# Altium integrated library Tact_Switches_rev15a.intlib: 108 symbols
Pins are listed as number, name and electrical type; pins without a type are passive.

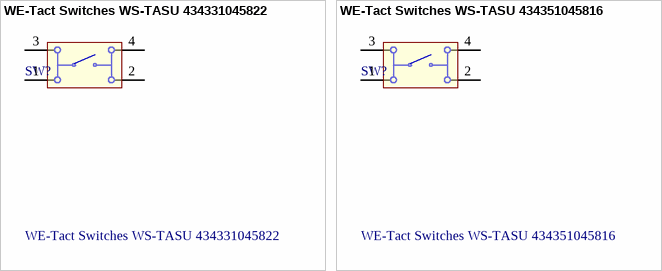
[diagram p0: symbols WE-Tact Switches WS-TASU 434331045822 to WE-Tact Switches WS-TASU 434351045816]

## WE-Tact Switches WS-TASU 434331045822
designator SW?
WS-TASU SMD Tact Switch 4.7X3.5 mm side push; Manufacturer: Würth Elektronik eiSos GmbH & Co.KG; ComponentLink1 Description: Manufacturer; ComponentLink2 Description: Datasheet; Creat by: Karrer Zheng; NoPins: 04; Creat Date: 6 March February 2014; partNo: 434331045822; ComponentLink1URL: http://www.we-online.com; ComponentLink2URL: http://katalog.we-online.de/em/datasheet/434331045822.pdf
footprint 434331045822 (4.7*3.5mm side push type,SMD, height 1.65mm, black actuator, 220gf, T&R)
pins: 1, 2, 3, 4

## WE-Tact Switches WS-TASU 434351045816
designator SW?
WS-TASU SMD Tact Switch 4.7X3.5 mm side push; Manufacturer: Würth Elektronik eiSos GmbH & Co.KG; ComponentLink1 Description: Manufacturer; ComponentLink2 Description: Datasheet; Creat by: Karrer Zheng; NoPins: 04; Creat Date: 6 March February 2014; partNo: 434351045816; ComponentLink1URL: http://www.we-online.com; ComponentLink2URL: http://katalog.we-online.de/em/datasheet/434351045816.pdf
footprint 434351045816 (4.7*3.5mm side push type, SMD, height 1.65mm, white actuator, 160gf, T&R)
pins: 1, 2, 3, 4


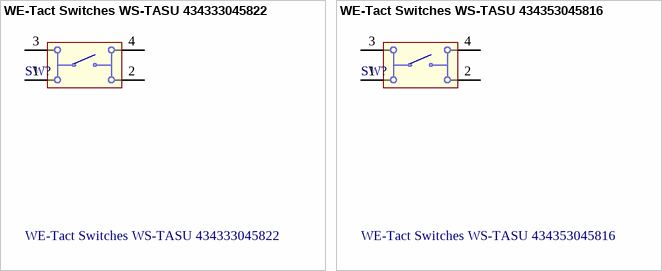
[diagram p1: symbols WE-Tact Switches WS-TASU 434333045822 to WE-Tact Switches WS-TASU 434353045816]

## WE-Tact Switches WS-TASU 434333045822
designator SW?
WS-TASU J-Bend SMD Tact Switch 4.7X3.5 mm side push; Manufacturer: Würth Elektronik eiSos GmbH & Co.KG; ComponentLink1 Description: Manufacturer; ComponentLink2 Description: Datasheet; Creat by: Karrer Zheng; NoPins: 04; Creat Date: 6 March February 2014; partNo: 434333045822; ComponentLink1URL: http://www.we-online.com; ComponentLink2URL: http://katalog.we-online.de/em/datasheet/434333045822.pdf
footprint 434333045822 (4.7*3.5mm side push type,J-Bend SMD, height 1.65mm, black actuator, 220gf, T&R)
pins: 1, 2, 3, 4

## WE-Tact Switches WS-TASU 434353045816
designator SW?
WS-TASU J-Bend SMD Tact Switch 4.7X3.5 mm side push; Manufacturer: Würth Elektronik eiSos GmbH & Co.KG; ComponentLink1 Description: Manufacturer; ComponentLink2 Description: Datasheet; Creat by: Karrer Zheng; NoPins: 04; Creat Date: 6 March February 2014; partNo: 434353045816; ComponentLink1URL: http://www.we-online.com; ComponentLink2URL: http://katalog.we-online.de/em/datasheet/434353045816.pdf
footprint 434353045816 (4.7*3.5mm side push type, J-Bend SMD, height 1.65mm, white actuator, 160gf, T&R)
pins: 1, 2, 3, 4


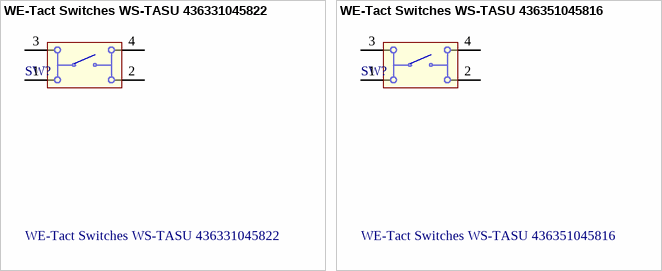
[diagram p2: symbols WE-Tact Switches WS-TASU 436331045822 to WE-Tact Switches WS-TASU 436351045816]

## WE-Tact Switches WS-TASU 436331045822
designator SW?
WS-TASU J-Bend SMD Tact Switch with boss design 4.7X3.5 mm side push; Manufacturer: Würth Elektronik eiSos GmbH & Co.KG; ComponentLink1 Description: Manufacturer; ComponentLink2 Description: Datasheet; Creat by: Karrer Zheng; NoPins: 04; Creat Date: 6 March February 2014; partNo: 436331045822; ComponentLink1URL: http://www.we-online.com; ComponentLink2URL: http://katalog.we-online.de/em/datasheet/436331045822.pdf
footprint 436331045822 (4.7*3.5mm, side push type, SMD, with boss design, height 1.65mm, black actuator , 220gf, T&R)
pins: 1, 2, 3, 4

## WE-Tact Switches WS-TASU 436351045816
designator SW?
WS-TASU J-Bend SMD Tact Switch with boss design 4.7X3.5 mm side push; Manufacturer: Würth Elektronik eiSos GmbH & Co.KG; ComponentLink1 Description: Manufacturer; ComponentLink2 Description: Datasheet; Creat by: Karrer Zheng; NoPins: 04; Creat Date: 6 March February 2014; partNo: 436351045816; ComponentLink1URL: http://www.we-online.com; ComponentLink2URL: http://katalog.we-online.de/em/datasheet/436351045816.pdf
footprint 436351045816 (4.7*3.5mm side push type, SMD with boss design,  height 1.65mm, white actuator, 160gf, T&R)
pins: 1, 2, 3, 4


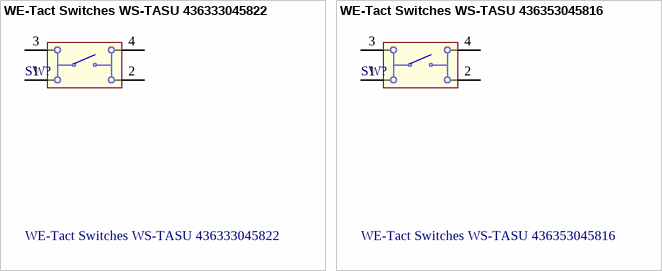
[diagram p3: symbols WE-Tact Switches WS-TASU 436333045822 to WE-Tact Switches WS-TASU 436353045816]

## WE-Tact Switches WS-TASU 436333045822
designator SW?
WS-TASU J-Bend J-Bend SMD Tact Switch with boss design 4.7X3.5 mm side push; Manufacturer: Würth Elektronik eiSos GmbH & Co.KG; ComponentLink1 Description: Manufacturer; ComponentLink2 Description: Datasheet; Creat by: Karrer Zheng; NoPins: 04; Creat Date: 6 March February 2014; partNo: 436333045822; ComponentLink1URL: http://www.we-online.com; ComponentLink2URL: http://katalog.we-online.de/em/datasheet/436333045822.pdf
footprint 436333045822 (4.7*3.5mm side push type, J-Bend SMD with boss design, height 1.65mm, black actuator, 220gf, T&R)
pins: 1, 2, 3, 4

## WE-Tact Switches WS-TASU 436353045816
designator SW?
WS-TASU J-Bend J-Bend SMD Tact Switch with boss design 4.7X3.5 mm side push; Manufacturer: Würth Elektronik eiSos GmbH & Co.KG; ComponentLink1 Description: Manufacturer; ComponentLink2 Description: Datasheet; Creat by: Karrer Zheng; NoPins: 04; Creat Date: 6 March February 2014; partNo: 436353045816; ComponentLink1URL: http://www.we-online.com; ComponentLink2URL: http://katalog.we-online.de/em/datasheet/436353045816.pdf
footprint 436353045816 (4.7*3.5mm side push type, J-Bend SMD with boss design,  height 1.65mm, white actuator, 160gf, T&R)
pins: 1, 2, 3, 4


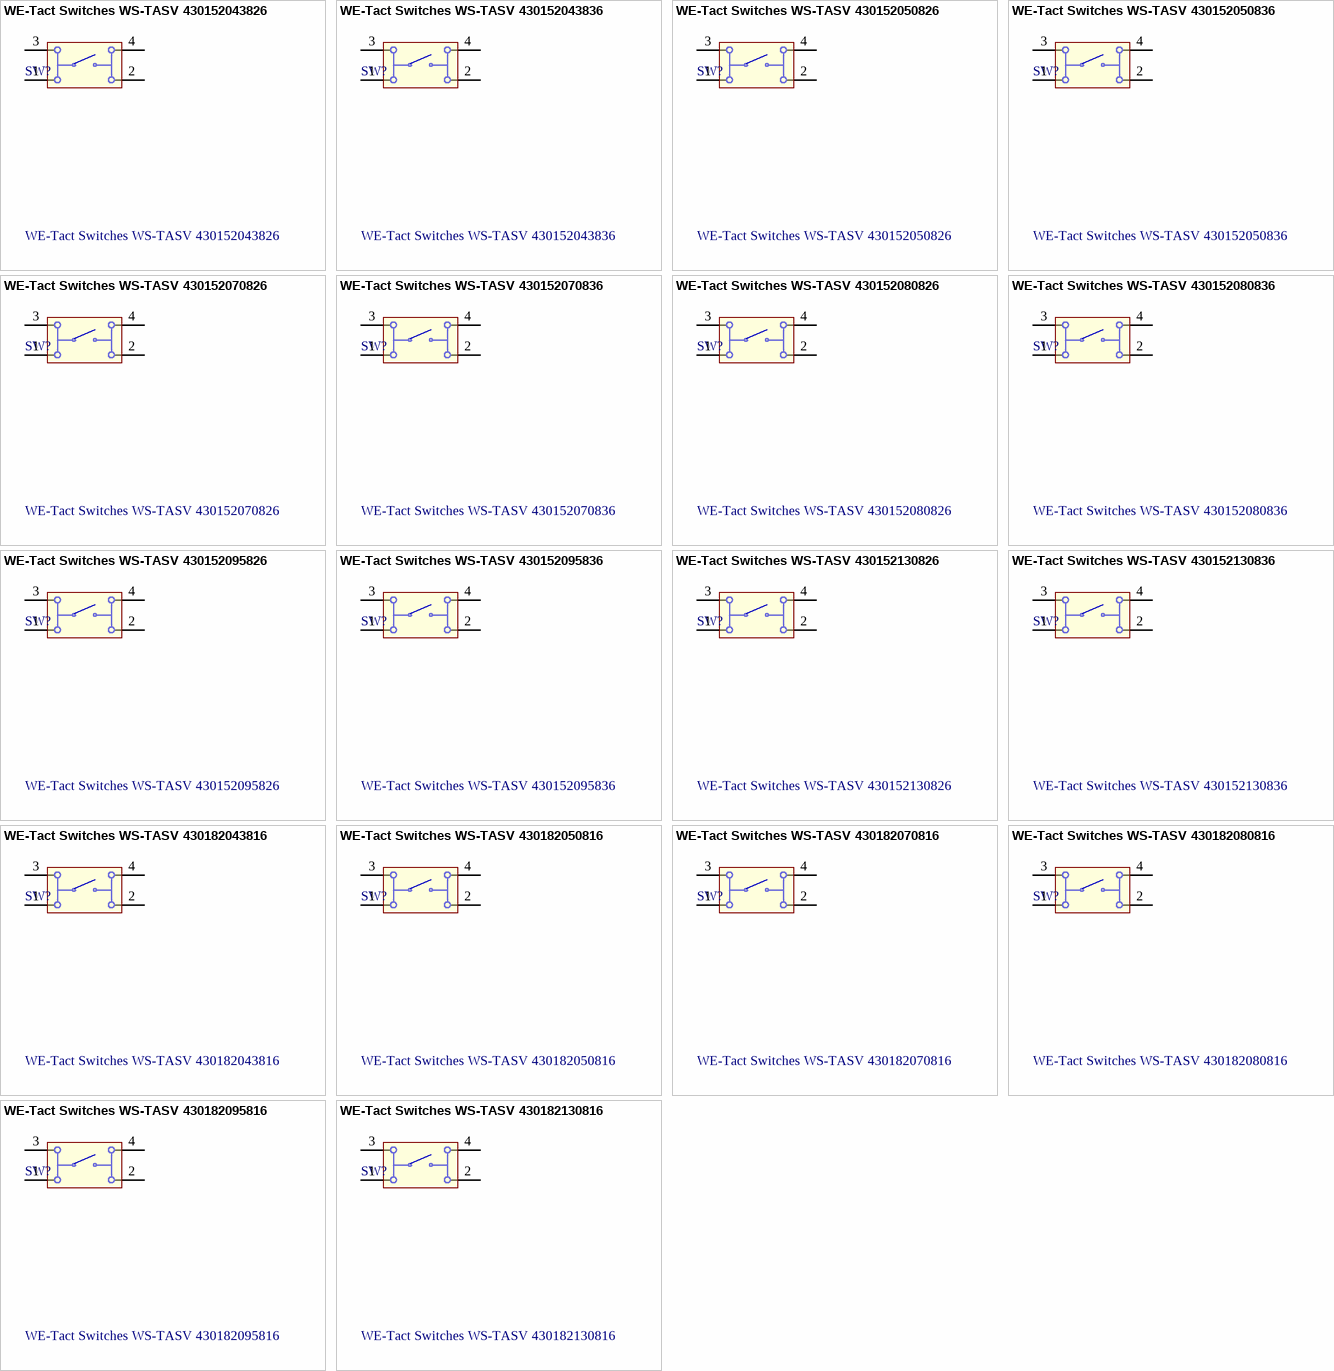
[diagram p4: symbols WE-Tact Switches WS-TASV 430152043826 to WE-Tact Switches WS-TASV 430182130816]

## WE-Tact Switches WS-TASV 430152043826
designator SW?
WS-TASV SMD Tact Switch 6X6 mm; Manufacturer: Würth Elektronik eiSos GmbH & Co.KG; ComponentLink1 Description: Manufacturer; ComponentLink2 Description: Datasheet; Creat by: Karrer Zheng; NoPins: 04; Creat Date: 28 February 2014; partNo: 430152043826; ComponentLink1URL: http://www.we-online.com; ComponentLink2URL: http://katalog.we-online.de/em/datasheet/4301x2.pdf
footprint 430152043826 (6*6mm vertical type, SMD, height 4.3mm, white actuator, 260gf, T&R)
pins: 1, 2, 3, 4

## WE-Tact Switches WS-TASV 430152043836
designator SW?
WS-TASV SMD Tact Switch 6X6 mm; Manufacturer: Würth Elektronik eiSos GmbH & Co.KG; ComponentLink1 Description: Manufacturer; ComponentLink2 Description: Datasheet; Creat by: Karrer Zheng; NoPins: 04; Creat Date: 28 February 2014; partNo: 430152043836; ComponentLink1URL: http://www.we-online.com; ComponentLink2URL: http://katalog.we-online.de/em/datasheet/4301x2.pdf
footprint 430152043836 (6*6mm vertical type, SMD, height 4.3mm, salmon actuator, 360gf, T&R)
pins: 1, 2, 3, 4

## WE-Tact Switches WS-TASV 430152050826
designator SW?
WS-TASV SMD Tact Switch 6X6 mm; Manufacturer: Würth Elektronik eiSos GmbH & Co.KG; ComponentLink1 Description: Manufacturer; ComponentLink2 Description: Datasheet; Creat by: Karrer Zheng; NoPins: 04; Creat Date: 28 February 2014; partNo: 430152050826; ComponentLink1URL: http://www.we-online.com; ComponentLink2URL: http://katalog.we-online.de/em/datasheet/4301x2.pdf
footprint 430152050826
pins: 1, 2, 3, 4

## WE-Tact Switches WS-TASV 430152050836
designator SW?
WS-TASV SMD Tact Switch 6X6 mm; Manufacturer: Würth Elektronik eiSos GmbH & Co.KG; ComponentLink1 Description: Manufacturer; ComponentLink2 Description: Datasheet; Creat by: Karrer Zheng; NoPins: 04; Creat Date: 28 February 2014; partNo: 430152050836; ComponentLink1URL: http://www.we-online.com; ComponentLink2URL: http://katalog.we-online.de/em/datasheet/4301x2.pdf
footprint 430152050836
pins: 1, 2, 3, 4

## WE-Tact Switches WS-TASV 430152070826
designator SW?
WS-TASV SMD Tact Switch 6X6 mm; Manufacturer: Würth Elektronik eiSos GmbH & Co.KG; ComponentLink1 Description: Manufacturer; ComponentLink2 Description: Datasheet; Creat by: Karrer Zheng; NoPins: 04; Creat Date: 28 February 2014; partNo: 430152070826; ComponentLink1URL: http://www.we-online.com; ComponentLink2URL: http://katalog.we-online.de/em/datasheet/4301x2.pdf
footprint 430152070826
pins: 1, 2, 3, 4

## WE-Tact Switches WS-TASV 430152070836
designator SW?
WS-TASV SMD Tact Switch 6X6 mm; Manufacturer: Würth Elektronik eiSos GmbH & Co.KG; ComponentLink1 Description: Manufacturer; ComponentLink2 Description: Datasheet; Creat by: Karrer Zheng; NoPins: 04; Creat Date: 28 February 2014; partNo: 430152070836; ComponentLink1URL: http://www.we-online.com; ComponentLink2URL: http://katalog.we-online.de/em/datasheet/4301x2.pdf
footprint 430152070836
pins: 1, 2, 3, 4

## WE-Tact Switches WS-TASV 430152080826
designator SW?
WS-TASV SMD Tact Switch 6X6 mm; Manufacturer: Würth Elektronik eiSos GmbH & Co.KG; ComponentLink1 Description: Manufacturer; ComponentLink2 Description: Datasheet; Creat by: Karrer Zheng; NoPins: 04; Creat Date: 28 February 2014; partNo: 430152080826; ComponentLink1URL: http://www.we-online.com; ComponentLink2URL: http://katalog.we-online.de/em/datasheet/4301x2.pdf
footprint 430152080826
pins: 1, 2, 3, 4

## WE-Tact Switches WS-TASV 430152080836
designator SW?
WS-TASV SMD Tact Switch 6X6 mm; Manufacturer: Würth Elektronik eiSos GmbH & Co.KG; ComponentLink1 Description: Manufacturer; ComponentLink2 Description: Datasheet; Creat by: Karrer Zheng; NoPins: 04; Creat Date: 28 February 2014; partNo: 430152080836; ComponentLink1URL: http://www.we-online.com; ComponentLink2URL: http://katalog.we-online.de/em/datasheet/4301x2.pdf
footprint 430152080836
pins: 1, 2, 3, 4

## WE-Tact Switches WS-TASV 430152095826
designator SW?
WS-TASV SMD Tact Switch 6X6 mm; Manufacturer: Würth Elektronik eiSos GmbH & Co.KG; ComponentLink1 Description: Manufacturer; ComponentLink2 Description: Datasheet; Creat by: Karrer Zheng; NoPins: 04; Creat Date: 28 February 2014; partNo: 430152095826; ComponentLink1URL: http://www.we-online.com; ComponentLink2URL: http://katalog.we-online.de/em/datasheet/4301x2.pdf
footprint 430152095826
pins: 1, 2, 3, 4

## WE-Tact Switches WS-TASV 430152095836
designator SW?
WS-TASV SMD Tact Switch 6X6 mm; Manufacturer: Würth Elektronik eiSos GmbH & Co.KG; ComponentLink1 Description: Manufacturer; ComponentLink2 Description: Datasheet; Creat by: Karrer Zheng; NoPins: 04; Creat Date: 28 February 2014; partNo: 430152095836; ComponentLink1URL: http://www.we-online.com; ComponentLink2URL: http://katalog.we-online.de/em/datasheet/4301x2.pdf
footprint 430152095836
pins: 1, 2, 3, 4

## WE-Tact Switches WS-TASV 430152130826
designator SW?
WS-TASV SMD Tact Switch 6X6 mm; Manufacturer: Würth Elektronik eiSos GmbH & Co.KG; ComponentLink1 Description: Manufacturer; ComponentLink2 Description: Datasheet; Creat by: Karrer Zheng; NoPins: 04; Creat Date: 28 February 2014; partNo: 430152130826; ComponentLink1URL: http://www.we-online.com; ComponentLink2URL: http://katalog.we-online.de/em/datasheet/4301x2.pdf
footprint 430152130826
pins: 1, 2, 3, 4

## WE-Tact Switches WS-TASV 430152130836
designator SW?
WS-TASV SMD Tact Switch 6X6 mm; Manufacturer: Würth Elektronik eiSos GmbH & Co.KG; ComponentLink1 Description: Manufacturer; ComponentLink2 Description: Datasheet; Creat by: Karrer Zheng; NoPins: 04; Creat Date: 28 February 2014; partNo: 430152130836; ComponentLink1URL: http://www.we-online.com; ComponentLink2URL: http://katalog.we-online.de/em/datasheet/4301x2.pdf
footprint 430152130836
pins: 1, 2, 3, 4

## WE-Tact Switches WS-TASV 430182043816
designator SW?
WS-TASV SMD Tact Switch 6X6 mm; Manufacturer: Würth Elektronik eiSos GmbH & Co.KG; ComponentLink1 Description: Manufacturer; ComponentLink2 Description: Datasheet; Creat by: Karrer Zheng; NoPins: 04; Creat Date: 28 February 2014; partNo: 430182043816; ComponentLink1URL: http://www.we-online.com; ComponentLink2URL: http://katalog.we-online.de/em/datasheet/4301x2.pdf
footprint 430182043816
pins: 1, 2, 3, 4

## WE-Tact Switches WS-TASV 430182050816
designator SW?
WS-TASV SMD Tact Switch 6X6 mm; Manufacturer: Würth Elektronik eiSos GmbH & Co.KG; ComponentLink1 Description: Manufacturer; ComponentLink2 Description: Datasheet; Creat by: Karrer Zheng; NoPins: 04; Creat Date: 28 February 2014; partNo: 430182050816; ComponentLink1URL: http://www.we-online.com; ComponentLink2URL: http://katalog.we-online.de/em/datasheet/4301x2.pdf
footprint 430182050816
pins: 1, 2, 3, 4

## WE-Tact Switches WS-TASV 430182070816
designator SW?
WS-TASV SMD Tact Switch 6X6 mm; Manufacturer: Würth Elektronik eiSos GmbH & Co.KG; ComponentLink1 Description: Manufacturer; ComponentLink2 Description: Datasheet; Creat by: Karrer Zheng; NoPins: 04; Creat Date: 28 February 2014; partNo: 430182070816; ComponentLink1URL: http://www.we-online.com; ComponentLink2URL: http://katalog.we-online.de/em/datasheet/4301x2.pdf
footprint 430182070816
pins: 1, 2, 3, 4

## WE-Tact Switches WS-TASV 430182080816
designator SW?
WS-TASV SMD Tact Switch 6X6 mm; Manufacturer: Würth Elektronik eiSos GmbH & Co.KG; ComponentLink1 Description: Manufacturer; ComponentLink2 Description: Datasheet; Creat by: Karrer Zheng; NoPins: 04; Creat Date: 28 February 2014; partNo: 430182080816; ComponentLink1URL: http://www.we-online.com; ComponentLink2URL: http://katalog.we-online.de/em/datasheet/4301x2.pdf
footprint 430182080816 (6*6mm vertical type, SMD, height 8.0mm, black actuator, 160gf, T&R)
pins: 1, 2, 3, 4

## WE-Tact Switches WS-TASV 430182095816
designator SW?
WS-TASV SMD Tact Switch 6X6 mm; Manufacturer: Würth Elektronik eiSos GmbH & Co.KG; ComponentLink1 Description: Manufacturer; ComponentLink2 Description: Datasheet; Creat by: Karrer Zheng; NoPins: 04; Creat Date: 28 February 2014; partNo: 430182095816; ComponentLink1URL: http://www.we-online.com; ComponentLink2URL: http://katalog.we-online.de/em/datasheet/4301x2.pdf
footprint 430182095816
pins: 1, 2, 3, 4

## WE-Tact Switches WS-TASV 430182130816
designator SW?
WS-TASV SMD Tact Switch 6X6 mm; Manufacturer: Würth Elektronik eiSos GmbH & Co.KG; ComponentLink1 Description: Manufacturer; ComponentLink2 Description: Datasheet; Creat by: Karrer Zheng; NoPins: 04; Creat Date: 28 February 2014; partNo: 430182130816; ComponentLink1URL: http://www.we-online.com; ComponentLink2URL: http://katalog.we-online.de/em/datasheet/4301x2.pdf
footprint 430182130816
pins: 1, 2, 3, 4


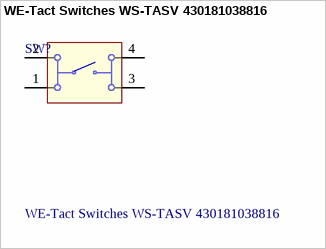
[diagram p5: symbol WE-Tact Switches WS-TASV 430181038816]

## WE-Tact Switches WS-TASV 430181038816
designator SW?
WS-TASV SMD Tact Switch 4.5X4.5 mm; Manufacturer: W¨¹rth Elektronik eiSos GmbH & Co.KG; ComponentLink1 Description: Manufacturer; ComponentLink2 Description: Datasheet; Creat by: Karrer Zheng; NoPins: 04; Creat Date: 5 March February 2014; partNo: 430181038816; ComponentLink1URL: http://www.we-online.com; ComponentLink2URL: http://katalog.we-online.de/em/datasheet/430181038816.pdf
footprint 430181038816 (4.5*4.5mm vertical type, SMD, height 3.8mm, black actuator, 160gf, T&R)
pins: 1, 2, 3, 4


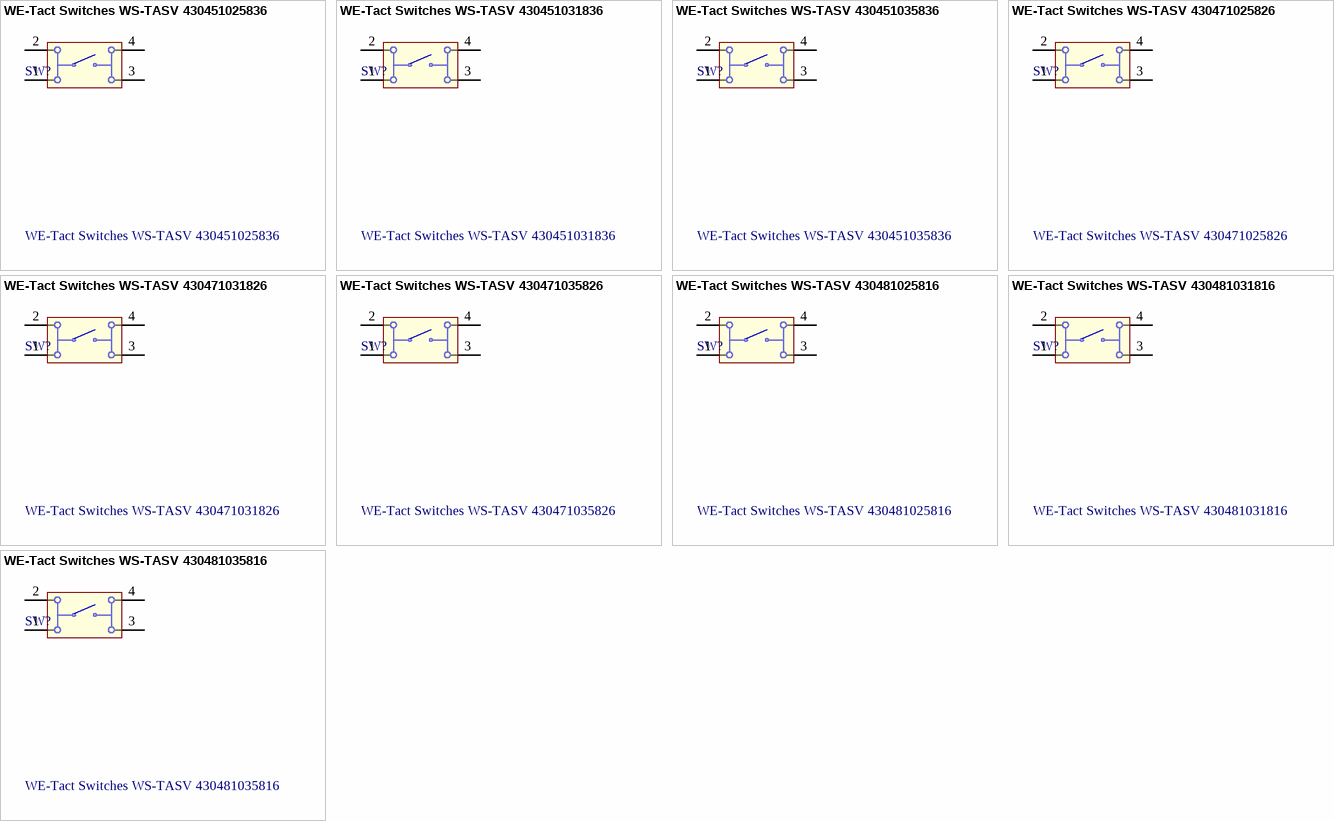
[diagram p6: symbols WE-Tact Switches WS-TASV 430451025836 to WE-Tact Switches WS-TASV 430481035816]

## WE-Tact Switches WS-TASV 430451025836
designator SW?
WS-TASV SMD Tact Switch 6X6 mm; Manufacturer: Würth Elektronik eiSos GmbH & Co.KG; ComponentLink1 Description: Manufacturer; ComponentLink2 Description: Datasheet; Creat by: Karrer Zheng; NoPins: 04; Creat Date: 4 March February 2014; partNo: 430451025836; ComponentLink1URL: http://www.we-online.com; ComponentLink2URL: http://katalog.we-online.de/em/datasheet/4304x1.pdf
footprint 430451025836 (6*6mm vertical type, SMD, height 2.5mm, salmon actuator, 360gf, T&R)
pins: 1, 2, 3, 4

## WE-Tact Switches WS-TASV 430451031836
designator SW?
WS-TASV SMD Tact Switch 6X6 mm; Manufacturer: Würth Elektronik eiSos GmbH & Co.KG; ComponentLink1 Description: Manufacturer; ComponentLink2 Description: Datasheet; Creat by: Karrer Zheng; NoPins: 04; Creat Date: 4 March February 2014; partNo: 430451031836; ComponentLink1URL: http://www.we-online.com; ComponentLink2URL: http://katalog.we-online.de/em/datasheet/4304x1.pdf
footprint 430451031836 (6*6mm vertical type,SMD, height 3.1mm, salmon actuator, 360gf, T&R)
pins: 1, 2, 3, 4

## WE-Tact Switches WS-TASV 430451035836
designator SW?
WS-TASV SMD Tact Switch 6X6 mm; Manufacturer: Würth Elektronik eiSos GmbH & Co.KG; ComponentLink1 Description: Manufacturer; ComponentLink2 Description: Datasheet; Creat by: Karrer Zheng; NoPins: 04; Creat Date: 4 March February 2014; partNo: 430451035836; ComponentLink1URL: http://www.we-online.com; ComponentLink2URL: http://katalog.we-online.de/em/datasheet/4304x1.pdf
footprint 430451035836 (6*6mm vertical type,SMD,  height 3.5mm, salmon actuator, 360gf, T&R)
pins: 1, 2, 3, 4

## WE-Tact Switches WS-TASV 430471025826
designator SW?
WS-TASV SMD Tact Switch 6X6 mm; Manufacturer: Würth Elektronik eiSos GmbH & Co.KG; ComponentLink1 Description: Manufacturer; ComponentLink2 Description: Datasheet; Creat by: Karrer Zheng; NoPins: 04; Creat Date: 4 March February 2014; partNo: 430471025826; ComponentLink1URL: http://www.we-online.com; ComponentLink2URL: http://katalog.we-online.de/em/datasheet/4304x1.pdf
footprint 430471025826 (6*6mm vertical type,SMD, height 2.5mm, white actuator, 260gf, T&R)
pins: 1, 2, 3, 4

## WE-Tact Switches WS-TASV 430471031826
designator SW?
WS-TASV SMD Tact Switch 6X6 mm; Manufacturer: Würth Elektronik eiSos GmbH & Co.KG; ComponentLink1 Description: Manufacturer; ComponentLink2 Description: Datasheet; Creat by: Karrer Zheng; NoPins: 04; Creat Date: 4 March February 2014; partNo: 430471031826; ComponentLink1URL: http://www.we-online.com; ComponentLink2URL: http://katalog.we-online.de/em/datasheet/4304x1.pdf
footprint 430471031826 (6*6mm vertical type,SMD, height 3.1mm, white actuator, 260gf, T&R)
pins: 1, 2, 3, 4

## WE-Tact Switches WS-TASV 430471035826
designator SW?
WS-TASV SMD Tact Switch 6X6 mm; Manufacturer: Würth Elektronik eiSos GmbH & Co.KG; ComponentLink1 Description: Manufacturer; ComponentLink2 Description: Datasheet; Creat by: Karrer Zheng; NoPins: 04; Creat Date: 4 March February 2014; partNo: 430471035826; ComponentLink1URL: http://www.we-online.com; ComponentLink2URL: http://katalog.we-online.de/em/datasheet/4304x1.pdf
footprint 430471035826 (6*6mm vertical type,SMD,  height 3.5mm, white actuator, 260gf, T&R)
pins: 1, 2, 3, 4

## WE-Tact Switches WS-TASV 430481025816
designator SW?
WS-TASV SMD Tact Switch 6X6 mm; Manufacturer: Würth Elektronik eiSos GmbH & Co.KG; ComponentLink1 Description: Manufacturer; ComponentLink2 Description: Datasheet; Creat by: Karrer Zheng; NoPins: 04; Creat Date: 4 March February 2014; partNo: 430481025816; ComponentLink1URL: http://www.we-online.com; ComponentLink2URL: http://katalog.we-online.de/em/datasheet/4304x1.pdf
footprint 430481025816 (6*6mm vertical type,SMD, height 2.5mm, black actuator, 160gf, T&R)
pins: 1, 2, 3, 4

## WE-Tact Switches WS-TASV 430481031816
designator SW?
WS-TASV SMD Tact Switch 6X6 mm; Manufacturer: Würth Elektronik eiSos GmbH & Co.KG; ComponentLink1 Description: Manufacturer; ComponentLink2 Description: Datasheet; Creat by: Karrer Zheng; NoPins: 04; Creat Date: 4 March February 2014; partNo: 430481031816; ComponentLink1URL: http://www.we-online.com; ComponentLink2URL: http://katalog.we-online.de/em/datasheet/4304x1.pdf
footprint 430481031816 (6*6mm vertical type,SMD, height 3.1mm, black actuator, 160gf, T&R)
pins: 1, 2, 3, 4

## WE-Tact Switches WS-TASV 430481035816
designator SW?
WS-TASV SMD Tact Switch 6X6 mm; Manufacturer: Würth Elektronik eiSos GmbH & Co.KG; ComponentLink1 Description: Manufacturer; ComponentLink2 Description: Datasheet; Creat by: Karrer Zheng; NoPins: 04; Creat Date: 4 March February 2014; partNo: 430481035816; ComponentLink1URL: http://www.we-online.com; ComponentLink2URL: http://katalog.we-online.de/em/datasheet/4304x1.pdf
footprint 430481035816 (6*6mm vertical type,SMD, height 3.5mm, black actuator, 160gf, T&R)
pins: 1, 2, 3, 4


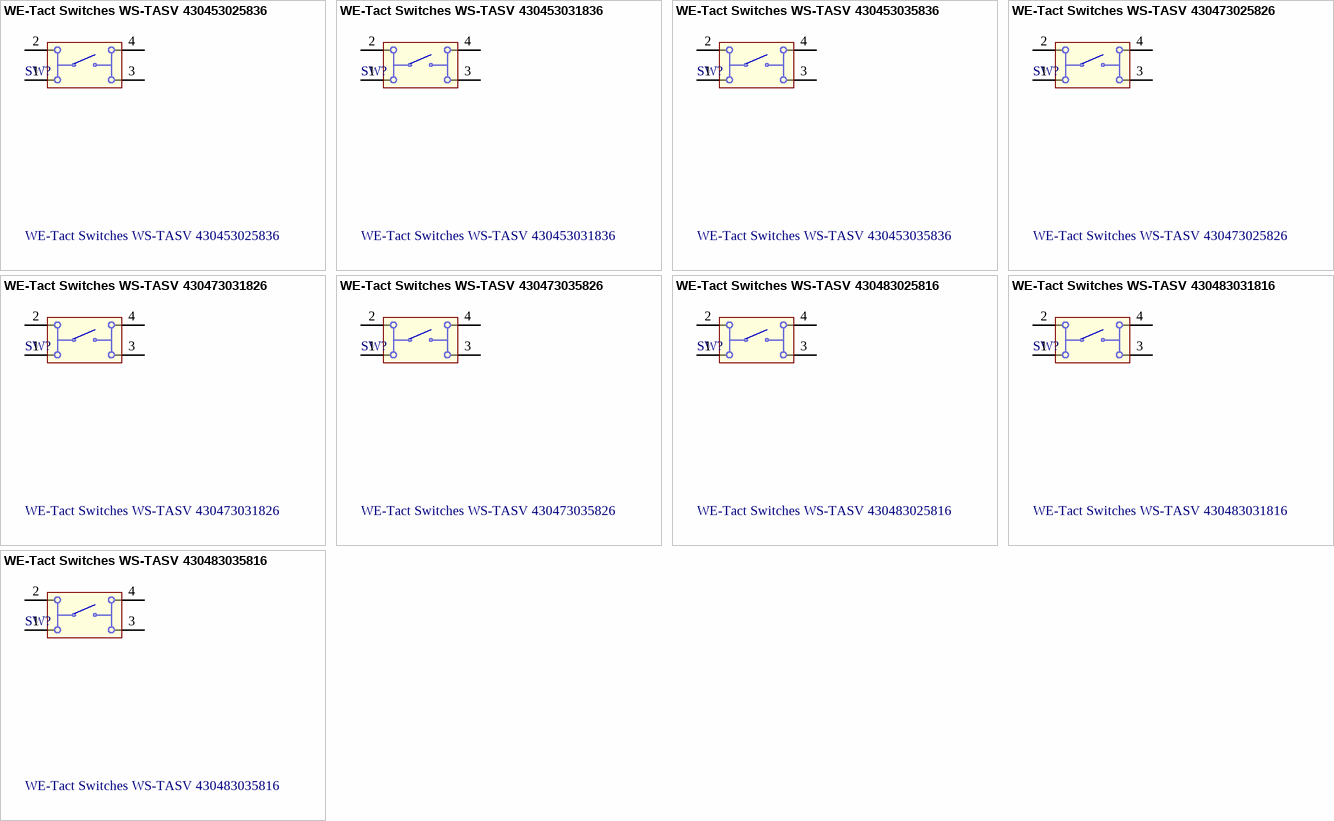
[diagram p7: symbols WE-Tact Switches WS-TASV 430453025836 to WE-Tact Switches WS-TASV 430483035816]

## WE-Tact Switches WS-TASV 430453025836
designator SW?
WS-TASV J-Bend SMD Tact Switch 6X6 mm; Manufacturer: Würth Elektronik eiSos GmbH & Co.KG; ComponentLink1 Description: Manufacturer; ComponentLink2 Description: Datasheet; Creat by: Karrer Zheng; NoPins: 04; Creat Date: 4 March February 2014; partNo: 430453025836; ComponentLink1URL: http://www.we-online.com; ComponentLink2URL: http://katalog.we-online.de/em/datasheet/4304x3.pdf
footprint 430453025836 (6*6mm washable vertical type, J-Bend SMD, height 2.5mm, salmon actuator, 360gf, T&R)
pins: 1, 2, 3, 4

## WE-Tact Switches WS-TASV 430453031836
designator SW?
WS-TASV J-Bend SMD Tact Switch 6X6 mm; Manufacturer: Würth Elektronik eiSos GmbH & Co.KG; ComponentLink1 Description: Manufacturer; ComponentLink2 Description: Datasheet; Creat by: Karrer Zheng; NoPins: 04; Creat Date: 4 March February 2014; partNo: 430453031836; ComponentLink1URL: http://www.we-online.com; ComponentLink2URL: http://katalog.we-online.de/em/datasheet/4304x3.pdf
footprint 430453031836 (6*6mm vertical type, J-Bend SMD, height 3.1mm, salmon actuator, 360gf, T&R)
pins: 1, 2, 3, 4

## WE-Tact Switches WS-TASV 430453035836
designator SW?
WS-TASV J-Bend SMD Tact Switch 6X6 mm; Manufacturer: Würth Elektronik eiSos GmbH & Co.KG; ComponentLink1 Description: Manufacturer; ComponentLink2 Description: Datasheet; Creat by: Karrer Zheng; NoPins: 04; Creat Date: 4 March February 2014; partNo: 430453035836; ComponentLink1URL: http://www.we-online.com; ComponentLink2URL: http://katalog.we-online.de/em/datasheet/4304x3.pdf
footprint 430453035836 (6*6mm vertical type, J-Bend SMD,  height 3.5mm, salmon actuator, 360gf, T&R)
pins: 1, 2, 3, 4

## WE-Tact Switches WS-TASV 430473025826
designator SW?
WS-TASV J-Bend SMD Tact Switch 6X6 mm; Manufacturer: Würth Elektronik eiSos GmbH & Co.KG; ComponentLink1 Description: Manufacturer; ComponentLink2 Description: Datasheet; Creat by: Karrer Zheng; NoPins: 04; Creat Date: 4 March February 2014; partNo: 430473025826; ComponentLink1URL: http://www.we-online.com; ComponentLink2URL: http://katalog.we-online.de/em/datasheet/4304x3.pdf
footprint 430473025826 (6*6mm vertical type, J-Bend SMD, height 2.5mm, white actuator, 260gf, T&R)
pins: 1, 2, 3, 4

## WE-Tact Switches WS-TASV 430473031826
designator SW?
WS-TASV J-Bend SMD Tact Switch 6X6 mm; Manufacturer: Würth Elektronik eiSos GmbH & Co.KG; ComponentLink1 Description: Manufacturer; ComponentLink2 Description: Datasheet; Creat by: Karrer Zheng; NoPins: 04; Creat Date: 4 March February 2014; partNo: 430473031826; ComponentLink1URL: http://www.we-online.com; ComponentLink2URL: http://katalog.we-online.de/em/datasheet/4304x3.pdf
footprint 430473031826 (6*6mm vertical type, J-Bend SMD, height 3.1mm, white actuator, 260gf, T&R)
pins: 1, 2, 3, 4

## WE-Tact Switches WS-TASV 430473035826
designator SW?
WS-TASV J-Bend SMD Tact Switch 6X6 mm; Manufacturer: Würth Elektronik eiSos GmbH & Co.KG; ComponentLink1 Description: Manufacturer; ComponentLink2 Description: Datasheet; Creat by: Karrer Zheng; NoPins: 04; Creat Date: 4 March February 2014; partNo: 430473035826; ComponentLink1URL: http://www.we-online.com; ComponentLink2URL: http://katalog.we-online.de/em/datasheet/4304x3.pdf
footprint 430473035826 (6*6mm vertical type, J-Bend SMD,  height 3.5mm, white actuator, 260gf, T&R)
pins: 1, 2, 3, 4

## WE-Tact Switches WS-TASV 430483025816
designator SW?
WS-TASV J-Bend SMD Tact Switch 6X6 mm; Manufacturer: Würth Elektronik eiSos GmbH & Co.KG; ComponentLink1 Description: Manufacturer; ComponentLink2 Description: Datasheet; Creat by: Karrer Zheng; NoPins: 04; Creat Date: 4 March February 2014; partNo: 430483025816; ComponentLink1URL: http://www.we-online.com; ComponentLink2URL: http://katalog.we-online.de/em/datasheet/4304x3.pdf
footprint 430483025816 (6*6mm vertical type, J-Bend SMD, height 2.5mm, black actuator, 160gf, T&R)
pins: 1, 2, 3, 4

## WE-Tact Switches WS-TASV 430483031816
designator SW?
WS-TASV J-Bend SMD Tact Switch 6X6 mm; Manufacturer: Würth Elektronik eiSos GmbH & Co.KG; ComponentLink1 Description: Manufacturer; ComponentLink2 Description: Datasheet; Creat by: Karrer Zheng; NoPins: 04; Creat Date: 4 March February 2014; partNo: 430483031816; ComponentLink1URL: http://www.we-online.com; ComponentLink2URL: http://katalog.we-online.de/em/datasheet/4304x3.pdf
footprint 430483031816 (6*6mm vertical type, J-Bend SMD, height 3.1mm, black actuator, 160gf, T&R)
pins: 1, 2, 3, 4

## WE-Tact Switches WS-TASV 430483035816
designator SW?
WS-TASV J-Bend SMD Tact Switch 6X6 mm; Manufacturer: Würth Elektronik eiSos GmbH & Co.KG; ComponentLink1 Description: Manufacturer; ComponentLink2 Description: Datasheet; Creat by: Karrer Zheng; NoPins: 04; Creat Date: 4 March February 2014; partNo: 430483035816; ComponentLink1URL: http://www.we-online.com; ComponentLink2URL: http://katalog.we-online.de/em/datasheet/4304x3.pdf
footprint 430483035816 (6*6mm vertical type, J-Bend SMD, height 3.5mm, black actuator, 160gf, T&R)
pins: 1, 2, 3, 4


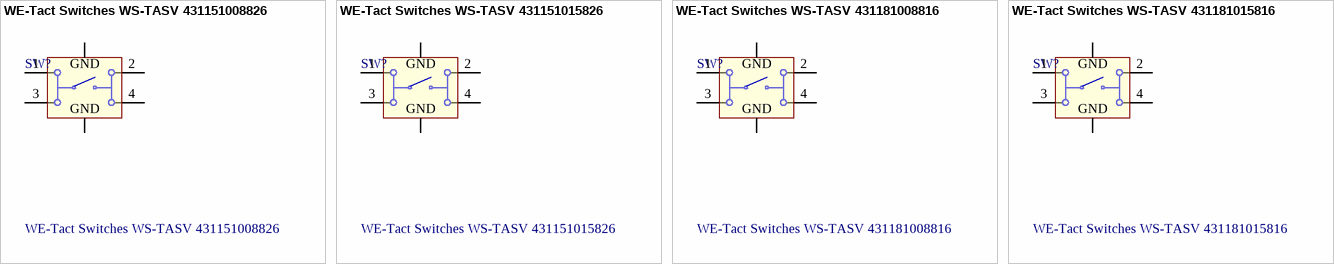
[diagram p8: symbols WE-Tact Switches WS-TASV 431151008826 to WE-Tact Switches WS-TASV 431181015816]

## WE-Tact Switches WS-TASV 431151008826
designator SW?
WS-TASV SMD Tact Switch 5X5 mm with ground terminal; Manufacturer: Würth Elektronik eiSos GmbH & Co.KG; ComponentLink1 Description: Manufacturer; ComponentLink2 Description: Datasheet; Creat by: Karrer Zheng; NoPins: 04; Creat Date: 4 March February 2014; partNo: 431151008826; ComponentLink1URL: http://www.we-online.com; ComponentLink2URL: http://katalog.we-online.de/em/datasheet/431151008826.pdf
footprint 431151008826 (5*5mm vertical type, SMD, height 0.8mm, no actuator, 260gf, Grounded Terminal, T&R)
pins: 1, 2, 3, 4, 5, 6
text: GND

## WE-Tact Switches WS-TASV 431151015826
designator SW?
WS-TASV SMD Tact Switch 5X5 mm with ground terminal; Manufacturer: Würth Elektronik eiSos GmbH & Co.KG; ComponentLink1 Description: Manufacturer; ComponentLink2 Description: Datasheet; Creat by: Karrer Zheng; NoPins: 04; Creat Date: 4 March February 2014; partNo: 431151015826; ComponentLink1URL: http://www.we-online.com; ComponentLink2URL: http://katalog.we-online.de/em/datasheet/431151015826.pdf
footprint 431151015826 (5*5mm vertical type, SMD, height 1.5mm, white actuator, 260gf, Grounded Terminal, T&R)
pins: 1, 2, 3, 4, 5, 6
text: GND

## WE-Tact Switches WS-TASV 431181008816
designator SW?
WS-TASV SMD Tact Switch 5X5 mm with ground terminal; Manufacturer: Würth Elektronik eiSos GmbH & Co.KG; ComponentLink1 Description: Manufacturer; ComponentLink2 Description: Datasheet; Creat by: Karrer Zheng; NoPins: 04; Creat Date: 4 March February 2014; partNo: 431181008816; ComponentLink1URL: http://www.we-online.com; ComponentLink2URL: http://katalog.we-online.de/em/datasheet/431181008816.pdf
footprint 431181008816 (5*5mm vertical type, SMD, height 0.8mm, no actuator, 160gf, Grounded Terminal, T&R)
pins: 1, 2, 3, 4, 5, 6
text: GND

## WE-Tact Switches WS-TASV 431181015816
designator SW?
WS-TASV SMD Tact Switch 5X5 mm with ground terminal; Manufacturer: Würth Elektronik eiSos GmbH & Co.KG; ComponentLink1 Description: Manufacturer; ComponentLink2 Description: Datasheet; Creat by: Karrer Zheng; NoPins: 04; Creat Date: 4 March February 2014; partNo: 431181015816; ComponentLink1URL: http://www.we-online.com; ComponentLink2URL: http://katalog.we-online.de/em/datasheet/431181015816.pdf
footprint 431181015816 (5*5mm vertical type, SMD, height 1.5mm, black actuator, 160gf, Grounded Terminal, T&R)
pins: 1, 2, 3, 4, 5, 6
text: GND


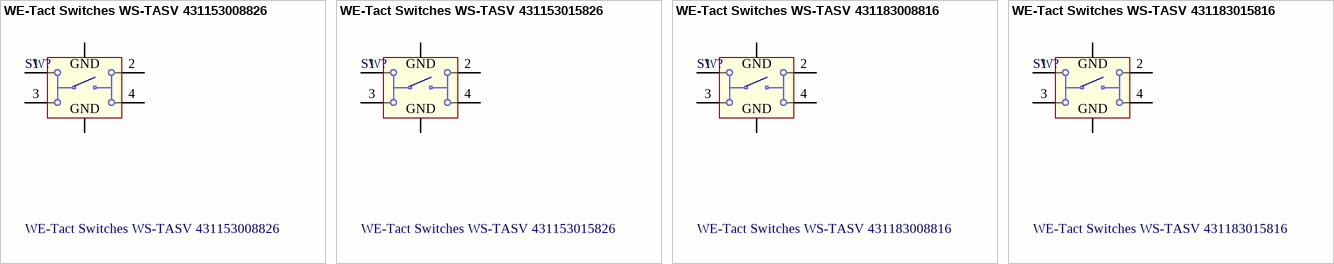
[diagram p9: symbols WE-Tact Switches WS-TASV 431153008826 to WE-Tact Switches WS-TASV 431183015816]

## WE-Tact Switches WS-TASV 431153008826
designator SW?
WS-TASV SMD Tact Switch 5X5 mm with ground terminal; Manufacturer: Würth Elektronik eiSos GmbH & Co.KG; ComponentLink1 Description: Manufacturer; ComponentLink2 Description: Datasheet; Creat by: Karrer Zheng; NoPins: 04; Creat Date: 5 March February 2014; partNo: 431153008826; ComponentLink1URL: http://www.we-online.com; ComponentLink2URL: http://katalog.we-online.de/em/datasheet/431153008826.pdf
footprint 431153008826
pins: 1, 2, 3, 4, 5, 6
text: GND

## WE-Tact Switches WS-TASV 431153015826
designator SW?
WS-TASV SMD Tact Switch 5X5 mm with ground terminal; Manufacturer: Würth Elektronik eiSos GmbH & Co.KG; ComponentLink1 Description: Manufacturer; ComponentLink2 Description: Datasheet; Creat by: Karrer Zheng; NoPins: 04; Creat Date: 5 March February 2014; partNo: 431153015826; ComponentLink1URL: http://www.we-online.com; ComponentLink2URL: http://katalog.we-online.de/em/datasheet/431153015826.pdf
footprint 431153015826
pins: 1, 2, 3, 4, 5, 6
text: GND

## WE-Tact Switches WS-TASV 431183008816
designator SW?
WS-TASV SMD Tact Switch 5X5 mm with ground terminal; Manufacturer: Würth Elektronik eiSos GmbH & Co.KG; ComponentLink1 Description: Manufacturer; ComponentLink2 Description: Datasheet; Creat by: Karrer Zheng; NoPins: 04; Creat Date: 5 March February 2014; partNo: 431183008816; ComponentLink1URL: http://www.we-online.com; ComponentLink2URL: http://katalog.we-online.de/em/datasheet/431153008826.pdf
footprint 431183008816
pins: 1, 2, 3, 4, 5, 6
text: GND
